# Altium footprint library Wurth_Elektronik_Electromechanic_Wire_to_Board_Connectors_rev16a.PCBLIB: 662 footprints (part 2 of 42)
Each footprint in its own frame and in the unit in brackets; x right, y up, seen from the top. Pads: shape width x height; smd on the part's side, far side on the other; paste and mask are expansions set on the pad; w line width, h text height; cw(c..) or ccw(c..) is an arc to the next point about the centre after c.
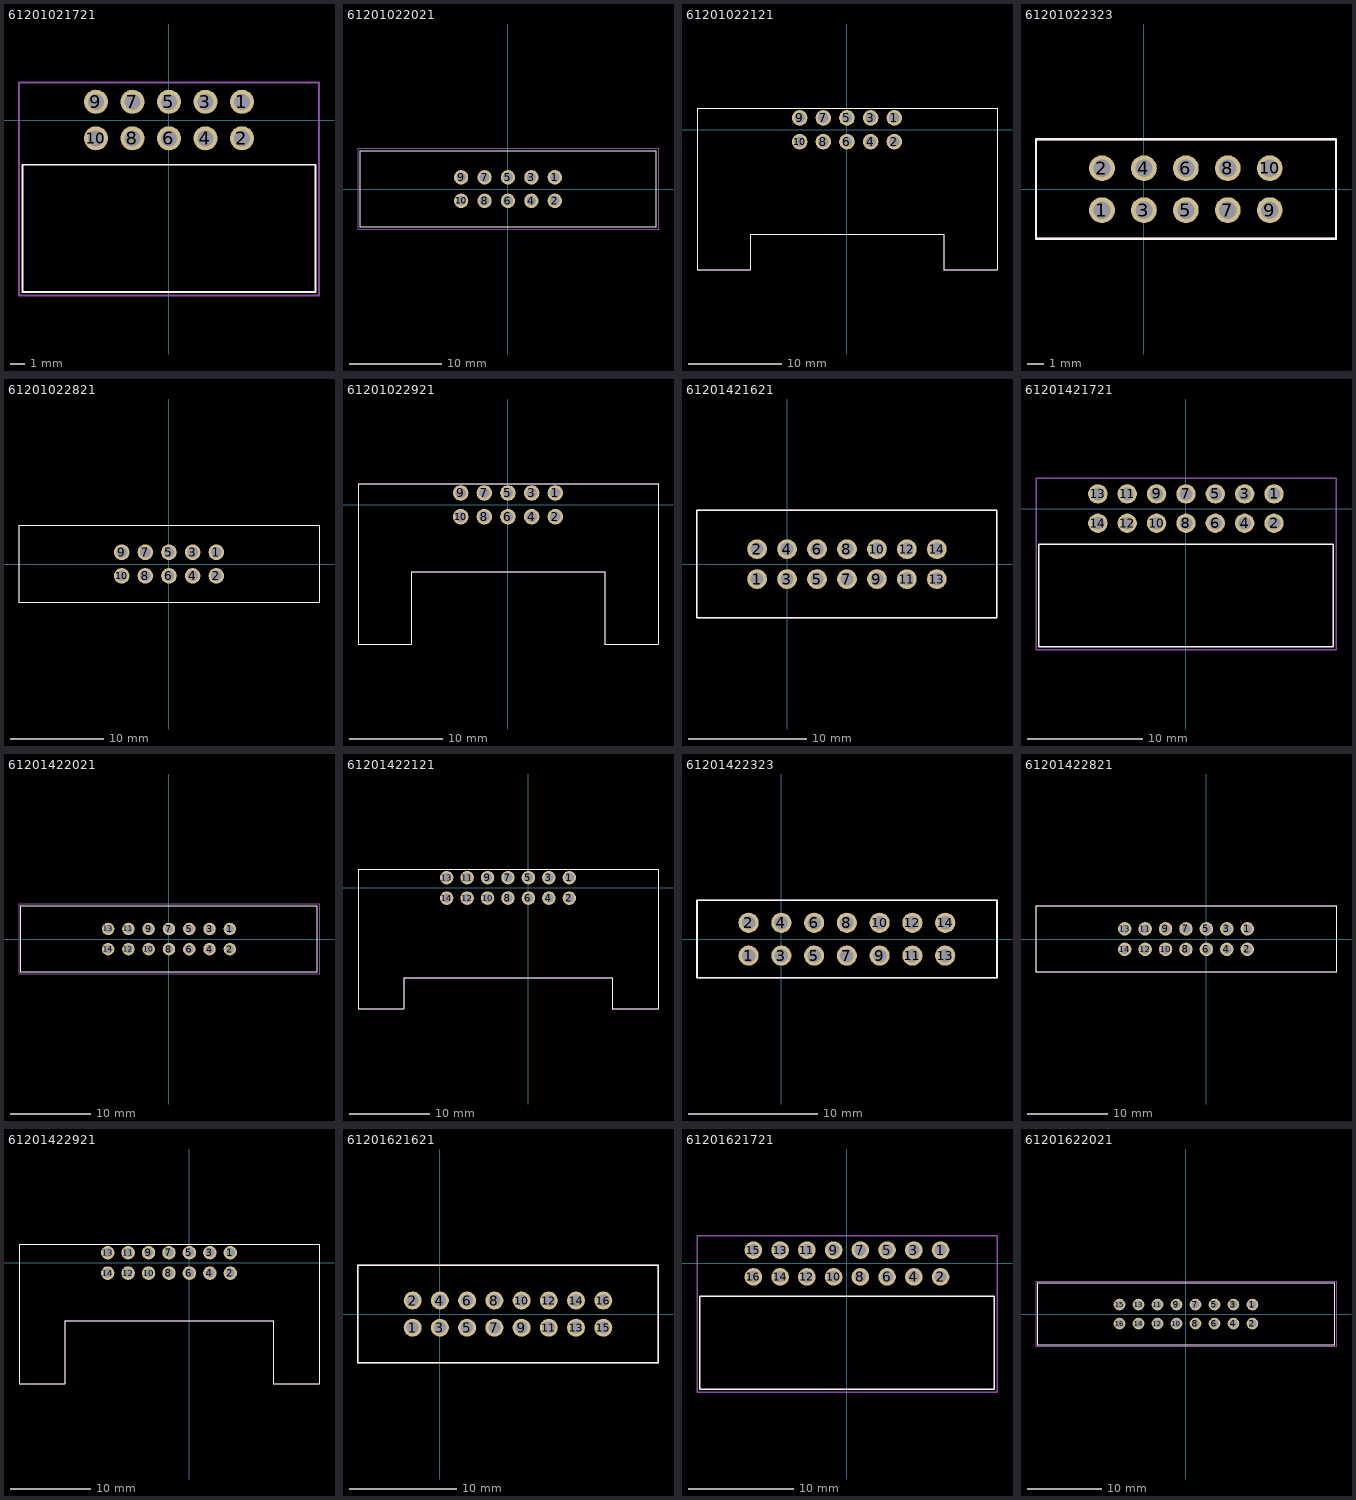
[diagram p1: the footprints below, top view; thin cyan lines are the x and y axes]

## 61201021721 [mil]
pads (10):
  round 66 hole 44: 1(200,50) 2(200,-50) 3(100,50) 4(100,-50) 5(0,50) 6(0,-50) 7(-100,50) 8(-100,-50) 9(-200,50) 10(-200,-50)
Top Overlay:
  lines w5: -400.79,-470.87 401,-470.87 401,-122.44 -400.79,-122.44 -400.79,-470.87
Mechanical 2:
  text ">NAME" at 456,-250.7 h77.5
Mechanical 4:
  text ">VALUE" at 456,-348.7 h77.5
Mechanical 16:
  text "1" at 175,25 h77.5
  text "10" at -250,-75 h77.5
  text "2" at 175,-75 h77.5
Mechanical 27:
  lines w5: -410.63,-480.71 411,-480.71 411,103 -410.63,103 -410.63,-480.71

## 61201022021 [mil]
pads (10):
  round 61.5 hole 41: 1(200,50) 2(200,-50) 3(100,50) 4(100,-50) 5(0,50) 6(0,-50) 7(-100,50) 8(-100,-50) 9(-200,50) 10(-200,-50)
Top Overlay:
  lines w5: -629.92,-163.39 630,-163.39 630,164 -629.92,164 -629.92,-163.39
Mechanical 2:
  text ">NAME" at -150,200 h77.5
Mechanical 4:
  text ">VALUE" at -175,-250 h77.5
Mechanical 16:
  text "1" at 175,25 h77.5
  text "10" at -250,-75 h77.5
  text "2" at 175,-75 h77.5
Mechanical 27:
  lines w5: -639.76,-173.23 640,-173.23 640,174 -639.76,174 -639.76,-173.23

## 61201022121 [mil]
pads (10):
  round 66 hole 44: 1(200,50) 2(200,-50) 3(100,50) 4(100,-50) 5(0,50) 6(0,-50) 7(-100,50) 8(-100,-50) 9(-200,50) 10(-200,-50)
Top Overlay:
  lines w5: -633.86,-590.55 -633.86,90 634,90 634,-590.55 410,-590.55 410,-440.94 -409.45,-440.94 -409.45,-590.55 -633.86,-590.55
Mechanical 2:
  text ">NAME" at -296.85,111 h77.5
Mechanical 4:
  text ">VALUE" at -279.92,-617.32 h77.5
Mechanical 16:
  lines w5: -633.86,-590.55 -409.45,-590.55 -409.45,-440.94 410,-440.94 410,-590.55 634,-590.55 634,90 -633.86,90 -633.86,-590.55
  text "1" at 175,25 h77.5
  text "10" at -250,-75 h77.5

## 61201022323 [mil]
pads (10):
  round 61.5 hole 41: 1(-100,-50) 2(-100,50) 3(0,-50) 4(0,50) 5(100,-50) 6(100,50) 7(200,-50) 8(200,50) 9(300,-50) 10(300,50)
Top Overlay:
  lines w5: -257.28,-118.11 458,-118.11 458,119 -257.28,119 -257.28,-118.11
Mechanical 2:
  text ">NAME" at -75,150 h77.5
Mechanical 4:
  text ">VALUE" at -100,-200 h77.5
Mechanical 16:
  lines w5: -257.28,-118.11 458,-118.11 458,119 -257.28,119 -257.28,-118.11
  text "1" at -125,-75 h77.5
  text "10" at 250,25 h77.5

## 61201022821 [mil]
pads (10):
  round 66 hole 44: 1(200,50) 2(200,-50) 3(100,50) 4(100,-50) 5(0,50) 6(0,-50) 7(-100,50) 8(-100,-50) 9(-200,50) 10(-200,-50)
Top Overlay:
  lines w5: -633.86,-163.39 634,-163.39 634,164 -633.86,164 -633.86,-163.39
Mechanical 2:
  text ">NAME" at -150,200 h77.5
Mechanical 4:
  text ">VALUE" at -175,-250 h77.5
Mechanical 16:
  lines w5: -633.86,-163.39 634,-163.39 634,164 -633.86,164 -633.86,-163.39
  text "1" at 175,25 h77.5
  text "10" at -250,-75 h77.5

## 61201022921 [mil]
pads (10):
  round 66 hole 44: 1(200,50) 2(200,-50) 3(100,50) 4(100,-50) 5(0,50) 6(0,-50) 7(-100,50) 8(-100,-50) 9(-200,50) 10(-200,-50)
Top Overlay:
  lines w5: -633.86,-590.16 -633.86,90 634,90 634,-590.16 410,-590.16 410,-283.46 -409.45,-283.46 -409.45,-590.16 -633.86,-590.16
Mechanical 2:
  text ">NAME" at -100,150 h77.5
Mechanical 4:
  text ">VALUE" at -161.81,-507.09 h77.5
Mechanical 16:
  lines w5: -633.86,-590.16 -409.45,-590.16 -409.45,-283.46 410,-283.46 410,-590.16 634,-590.16 634,90 -633.86,90 -633.86,-590.16
  text "1" at 175,25 h77.5
  text "10" at -250,-75 h77.5

## 61201421621 [mil]
pads (14):
  round 66 hole 44: 1(-100,-50) 2(-100,50) 3(0,-50) 4(0,50) 5(100,-50) 6(100,50) 7(200,-50) 8(200,50) 9(300,-50) 10(300,50) 11(400,-50) 12(400,50) 13(500,-50) 14(500,50)
Top Overlay:
  lines w5: -300.79,-179.13 701,-179.13 701,180 -300.79,180 -300.79,-179.13
Mechanical 2:
  text ">NAME" at 75,200 h77.5
Mechanical 4:
  text ">VALUE" at 50,-250 h77.5
Mechanical 16:
  lines w5: -300.79,-179.13 701,-179.13 701,180 -300.79,180 -300.79,-179.13
  text "1" at -125,-75 h77.5
  text "14" at 457,22 h77.5

## 61201421721 [mil]
pads (14):
  round 66 hole 44: 1(300,50) 2(300,-50) 3(200,50) 4(200,-50) 5(100,50) 6(100,-50) 7(0,50) 8(0,-50) 9(-100,50) 10(-100,-50) 11(-200,50) 12(-200,-50) 13(-300,50) 14(-300,-50)
Top Overlay:
  lines w5: -500.79,-470.87 501,-470.87 501,-122.44 -500.79,-122.44 -500.79,-470.87
Mechanical 2:
  text ">NAME" at 557,-250.7 h77.5
Mechanical 4:
  text ">VALUE" at 557,-348.7 h77.5
Mechanical 16:
  text "1" at 275,25 h77.5
  text "14" at -350,-75 h77.5
  text "2" at 275,-75 h77.5
Mechanical 27:
  lines w5: -510.63,-480.71 511,-480.71 511,103 -510.63,103 -510.63,-480.71

## 61201422021 [mil]
pads (14):
  round 61.5 hole 41: 1(300,50) 2(300,-50) 3(200,50) 4(200,-50) 5(100,50) 6(100,-50) 7(0,50) 8(0,-50) 9(-100,50) 10(-100,-50) 11(-200,50) 12(-200,-50) 13(-300,50) 14(-300,-50)
Top Overlay:
  lines w5: -729.92,-163.39 730,-163.39 730,164 -729.92,164 -729.92,-163.39
Mechanical 2:
  text ">NAME" at -50,200 h77.5
Mechanical 4:
  text ">VALUE" at -75,-250 h77.5
Mechanical 16:
  text "1" at 175,25 h77.5
  text "14" at -450,-75 h77.5
  text "2" at 175,-75 h77.5
Mechanical 27:
  lines w5: -739.76,-173.23 740,-173.23 740,174 -739.76,174 -739.76,-173.23

## 61201422121 [mil]
pads (14):
  round 66 hole 44: 1(200,50) 2(200,-50) 3(100,50) 4(100,-50) 5(0,50) 6(0,-50) 7(-100,50) 8(-100,-50) 9(-200,50) 10(-200,-50) 11(-300,50) 12(-300,-50) 13(-400,50) 14(-400,-50)
Top Overlay:
  lines w5: -833.86,-590.55 -833.86,90 634,90 634,-590.55 410,-590.55 410,-440.94 -609.45,-440.94 -609.45,-590.55 -833.86,-590.55
Mechanical 2:
  text ">NAME" at -414.96,150 h77.5
Mechanical 4:
  text ">VALUE" at -437.4,-585.83 h77.5
Mechanical 16:
  lines w5: -833.86,-590.55 -609.45,-590.55 -609.45,-440.94 410,-440.94 410,-590.55 634,-590.55 634,90 -833.86,90 -833.86,-590.55
  text "1" at 175,25 h77.5
  text "14" at -450,-75 h77.5

## 61201422323 [mil]
pads (14):
  round 61.5 hole 41: 1(-100,-50) 2(-100,50) 3(0,-50) 4(0,50) 5(100,-50) 6(100,50) 7(200,-50) 8(200,50) 9(300,-50) 10(300,50) 11(400,-50) 12(400,50) 13(500,-50) 14(500,50)
Top Overlay:
  lines w5: -257.28,-118.11 658,-118.11 658,119 -257.28,119 -257.28,-118.11
Mechanical 2:
  text ">NAME" at 50,150 h77.5
Mechanical 4:
  text ">VALUE" at 50,-200 h77.5
Mechanical 16:
  lines w5: -257.28,-118.11 658,-118.11 658,119 -257.28,119 -257.28,-118.11
  text "1" at -125,-75 h77.5
  text "14" at 450,25 h77.5

## 61201422821 [mil]
pads (14):
  round 66 hole 44: 1(200,50) 2(200,-50) 3(100,50) 4(100,-50) 5(0,50) 6(0,-50) 7(-100,50) 8(-100,-50) 9(-200,50) 10(-200,-50) 11(-300,50) 12(-300,-50) 13(-400,50) 14(-400,-50)
Top Overlay:
  lines w5: -833.86,-163.39 634,-163.39 634,164 -833.86,164 -833.86,-163.39
Mechanical 2:
  text ">NAME" at -150,200 h77.5
Mechanical 4:
  text ">VALUE" at -175,-250 h77.5
Mechanical 16:
  lines w5: -833.86,-163.39 634,-163.39 634,164 -833.86,164 -833.86,-163.39
  text "1" at 175,25 h77.5
  text "14" at -450,-75 h77.5

## 61201422921 [mil]
pads (14):
  round 66 hole 44: 1(200,50) 2(200,-50) 3(100,50) 4(100,-50) 5(0,50) 6(0,-50) 7(-100,50) 8(-100,-50) 9(-200,50) 10(-200,-50) 11(-300,50) 12(-300,-50) 13(-400,50) 14(-400,-50)
Top Overlay:
  lines w5: -833.86,-590.16 -833.86,90 634,90 634,-590.16 410,-590.16 410,-283.46 -609.45,-283.46 -609.45,-590.16 -833.86,-590.16
Mechanical 2:
  text ">NAME" at -100,150 h77.5
Mechanical 4:
  text ">VALUE" at -161.81,-507.09 h77.5
Mechanical 16:
  lines w5: -833.86,-590.16 -609.45,-590.16 -609.45,-283.46 410,-283.46 410,-590.16 634,-590.16 634,90 -833.86,90 -833.86,-590.16
  text "1" at 175,25 h77.5
  text "14" at -450,-75 h77.5

## 61201621621 [mil]
pads (16):
  round 66 hole 44: 1(-100,-50) 2(-100,50) 3(0,-50) 4(0,50) 5(100,-50) 6(100,50) 7(200,-50) 8(200,50) 9(300,-50) 10(300,50) 11(400,-50) 12(400,50) 13(500,-50) 14(500,50) 15(600,-50) 16(600,50)
Top Overlay:
  lines w5: -300.79,-179.13 801,-179.13 801,180 -300.79,180 -300.79,-179.13
Mechanical 2:
  text ">NAME" at 175,200 h77.5
Mechanical 4:
  text ">VALUE" at 150,-250 h77.5
Mechanical 16:
  lines w5: -300.79,-179.13 801,-179.13 801,180 -300.79,180 -300.79,-179.13
  text "1" at -125,-75 h77.5
  text "16" at 557,22 h77.5

## 61201621721 [mil]
pads (16):
  round 66 hole 44: 1(350,50) 2(350,-50) 3(250,50) 4(250,-50) 5(150,50) 6(150,-50) 7(50,50) 8(50,-50) 9(-50,50) 10(-50,-50) 11(-150,50) 12(-150,-50) 13(-250,50) 14(-250,-50) 15(-350,50) 16(-350,-50)
Top Overlay:
  lines w5: -550.79,-470.87 551,-470.87 551,-122.44 -550.79,-122.44 -550.79,-470.87
Mechanical 2:
  text ">NAME" at 607,-250.7 h77.5
Mechanical 4:
  text ">VALUE" at 607,-348.7 h77.5
Mechanical 16:
  text "1" at 325,25 h77.5
  text "16" at -400,-75 h77.5
  text "2" at 325,-75 h77.5
Mechanical 27:
  lines w5: -560.63,-480.71 561,-480.71 561,103 -560.63,103 -560.63,-480.71

## 61201622021 [mil]
pads (16):
  round 61.5 hole 41: 1(350,50) 2(350,-50) 3(250,50) 4(250,-50) 5(150,50) 6(150,-50) 7(50,50) 8(50,-50) 9(-50,50) 10(-50,-50) 11(-150,50) 12(-150,-50) 13(-250,50) 14(-250,-50) 15(-350,50) 16(-350,-50)
Top Overlay:
  lines w5: -779.92,-163.39 780,-163.39 780,164 -779.92,164 -779.92,-163.39
Mechanical 2:
  text ">NAME" at -100,200 h77.5
Mechanical 4:
  text ">VALUE" at -125,-250 h77.5
Mechanical 16:
  text "1" at 325,25 h77.5
  text "16" at -400,-75 h77.5
  text "2" at 325,-75 h77.5
Mechanical 27:
  lines w5: -789.76,-173.23 790,-173.23 790,174 -789.76,174 -789.76,-173.23